# Altium footprint library 3.22-杂项.PcbLib: 985 footprints (part 57 of 64)
Each footprint in its own frame and in the unit in brackets; x right, y up, seen from the top. Pads: shape width x height; smd on the part's side, far side on the other; paste and mask are expansions set on the pad; w line width, h text height; cw(c..) or ccw(c..) is an arc to the next point about the centre after c.
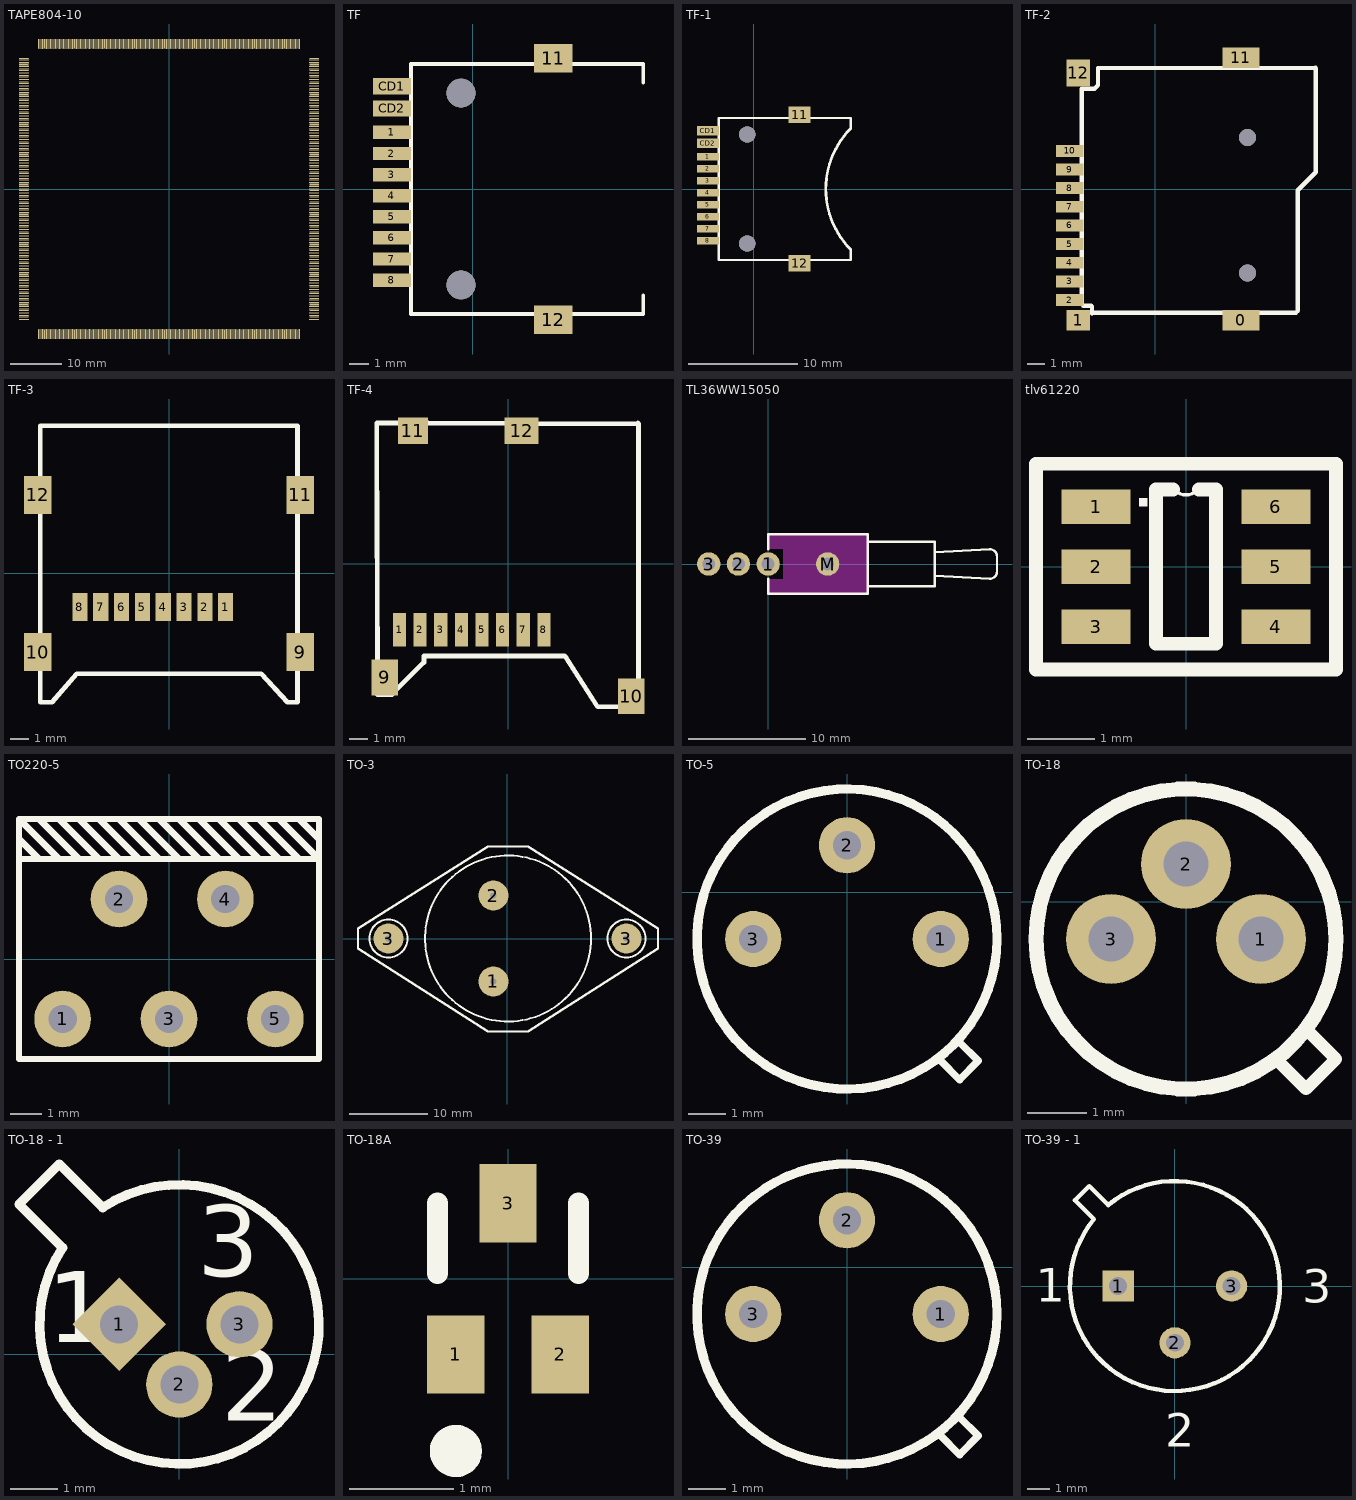
[diagram p56: the footprints below, top view; thin cyan lines are the x and y axes]

## TAPE804-10 [mil]
pads (804):
  oval 75x5 smd: 1(-1112.5,999.5) 2(-1112.5,989.5) 3(-1112.5,979.5) 4(-1112.5,969.5) 5(-1112.5,959.5) 6(-1112.5,949.5) 7(-1112.5,939.5) 8(-1112.5,929.5) 9(-1112.5,919.5) 10(-1112.5,909.5) 11(-1112.5,899.5) 12(-1112.5,889.5) 13(-1112.5,879.5) 14(-1112.5,869.5) 15(-1112.5,859.5) 16(-1112.5,849.5) 17(-1112.5,839.5) 18(-1112.5,829.5) 19(-1112.5,819.5) 20(-1112.5,809.5) 21(-1112.5,799.5) 22(-1112.5,789.5) 23(-1112.5,779.5) 24(-1112.5,769.5) 25(-1112.5,759.5) 26(-1112.5,749.5) 27(-1112.5,739.5) 28(-1112.5,729.5) 29(-1112.5,719.5) 30(-1112.5,709.5) 31(-1112.5,699.5) 32(-1112.5,689.5) 33(-1112.5,679.5) 34(-1112.5,669.5) 35(-1112.5,659.5) 36(-1112.5,649.5) 37(-1112.5,639.5) 38(-1112.5,629.5) 39(-1112.5,619.5) 40(-1112.5,609.5) 41(-1112.5,599.5) 42(-1112.5,589.5) 43(-1112.5,579.5) 44(-1112.5,569.5) 45(-1112.5,559.5) 46(-1112.5,549.5) 47(-1112.5,539.5) 48(-1112.5,529.5) 49(-1112.5,519.5) 50(-1112.5,509.5) 51(-1112.5,499.5) 52(-1112.5,489.5) 53(-1112.5,479.5) 54(-1112.5,469.5) 55(-1112.5,459.5) 56(-1112.5,449.5) 57(-1112.5,439.5) 58(-1112.5,429.5) 59(-1112.5,419.5) 60(-1112.5,409.5) 61(-1112.5,399.5) 62(-1112.5,389.5) 63(-1112.5,379.5) 64(-1112.5,369.5) 65(-1112.5,359.5) 66(-1112.5,349.5) 67(-1112.5,339.5) 68(-1112.5,329.5) 69(-1112.5,319.5) 70(-1112.5,309.5) 71(-1112.5,299.5) 72(-1112.5,289.5) 73(-1112.5,279.5) 74(-1112.5,269.5) 75(-1112.5,259.5) 76(-1112.5,249.5) 77(-1112.5,239.5) 78(-1112.5,229.5) 79(-1112.5,219.5) 80(-1112.5,209.5) 81(-1112.5,199.5) 82(-1112.5,189.5) 83(-1112.5,179.5) 84(-1112.5,169.5) 85(-1112.5,159.5) 86(-1112.5,149.5) 87(-1112.5,139.5) 88(-1112.5,129.5) 89(-1112.5,119.5) 90(-1112.5,109.5) 91(-1112.5,99.5) 92(-1112.5,89.5) 93(-1112.5,79.5) 94(-1112.5,69.5) 95(-1112.5,59.5) 96(-1112.5,49.5) 97(-1112.5,39.5) 98(-1112.5,29.5) 99(-1112.5,19.5) 100(-1112.5,9.5) 101(-1112.5,-0.5) 102(-1112.5,-10.5) 103(-1112.5,-20.5) 104(-1112.5,-30.5) 105(-1112.5,-40.5) 106(-1112.5,-50.5) 107(-1112.5,-60.5) 108(-1112.5,-70.5) 109(-1112.5,-80.5) 110(-1112.5,-90.5) 111(-1112.5,-100.5) 112(-1112.5,-110.5) 113(-1112.5,-120.5) 114(-1112.5,-130.5) 115(-1112.5,-140.5) 116(-1112.5,-150.5) 117(-1112.5,-160.5) 118(-1112.5,-170.5) 119(-1112.5,-180.5) 120(-1112.5,-190.5) 121(-1112.5,-200.5) 122(-1112.5,-210.5) 123(-1112.5,-220.5) 124(-1112.5,-230.5) 125(-1112.5,-240.5) 126(-1112.5,-250.5) 127(-1112.5,-260.5) 128(-1112.5,-270.5) 129(-1112.5,-280.5) 130(-1112.5,-290.5) 131(-1112.5,-300.5) 132(-1112.5,-310.5) 133(-1112.5,-320.5) 134(-1112.5,-330.5) 135(-1112.5,-340.5) 136(-1112.5,-350.5) 137(-1112.5,-360.5) 138(-1112.5,-370.5) 139(-1112.5,-380.5) 140(-1112.5,-390.5) 141(-1112.5,-400.5) 142(-1112.5,-410.5) 143(-1112.5,-420.5) 144(-1112.5,-430.5) 145(-1112.5,-440.5) 146(-1112.5,-450.5) 147(-1112.5,-460.5) 148(-1112.5,-470.5) 149(-1112.5,-480.5) 150(-1112.5,-490.5) 151(-1112.5,-500.5) 152(-1112.5,-510.5) 153(-1112.5,-520.5) 154(-1112.5,-530.5) 155(-1112.5,-540.5) 156(-1112.5,-550.5) 157(-1112.5,-560.5) 158(-1112.5,-570.5) 159(-1112.5,-580.5) 160(-1112.5,-590.5) 161(-1112.5,-600.5) 162(-1112.5,-610.5) 163(-1112.5,-620.5) 164(-1112.5,-630.5) 165(-1112.5,-640.5) 166(-1112.5,-650.5) 167(-1112.5,-660.5) 168(-1112.5,-670.5) 169(-1112.5,-680.5) 170(-1112.5,-690.5) 171(-1112.5,-700.5) 172(-1112.5,-710.5) 173(-1112.5,-720.5) 174(-1112.5,-730.5) 175(-1112.5,-740.5) 176(-1112.5,-750.5) 177(-1112.5,-760.5) 178(-1112.5,-770.5) 179(-1112.5,-780.5) 180(-1112.5,-790.5) 181(-1112.5,-800.5) 182(-1112.5,-810.5) 183(-1112.5,-820.5) 184(-1112.5,-830.5) 185(-1112.5,-840.5) 186(-1112.5,-850.5) 187(-1112.5,-860.5) 188(-1112.5,-870.5) 189(-1112.5,-880.5) 190(-1112.5,-890.5) 191(-1112.5,-900.5) 192(-1112.5,-910.5) 193(-1112.5,-920.5) 194(-1112.5,-930.5) 195(-1112.5,-940.5) 196(-1112.5,-950.5) 197(-1112.5,-960.5) 198(-1112.5,-970.5) 199(-1112.5,-980.5) 200(-1112.5,-990.5) 201(-1112.5,-1000.5) 403(1112.5,-1000.5) 404(1112.5,-990.5) 405(1112.5,-980.5) 406(1112.5,-970.5) 407(1112.5,-960.5) 408(1112.5,-950.5) 409(1112.5,-940.5) 410(1112.5,-930.5) 411(1112.5,-920.5) 412(1112.5,-910.5) 413(1112.5,-900.5) 414(1112.5,-890.5) 415(1112.5,-880.5) 416(1112.5,-870.5) 417(1112.5,-860.5) 418(1112.5,-850.5) 419(1112.5,-840.5) 420(1112.5,-830.5) 421(1112.5,-820.5) 422(1112.5,-810.5) 423(1112.5,-800.5) 424(1112.5,-790.5) 425(1112.5,-780.5) 426(1112.5,-770.5) 427(1112.5,-760.5) 428(1112.5,-750.5) 429(1112.5,-740.5) 430(1112.5,-730.5) 431(1112.5,-720.5) 432(1112.5,-710.5) 433(1112.5,-700.5) 434(1112.5,-690.5) 435(1112.5,-680.5) 436(1112.5,-670.5) 437(1112.5,-660.5) 438(1112.5,-650.5) 439(1112.5,-640.5) 440(1112.5,-630.5) 441(1112.5,-620.5) 442(1112.5,-610.5) 443(1112.5,-600.5) 444(1112.5,-590.5) 445(1112.5,-580.5) 446(1112.5,-570.5) 447(1112.5,-560.5) 448(1112.5,-550.5) 449(1112.5,-540.5) 450(1112.5,-530.5) 451(1112.5,-520.5) 452(1112.5,-510.5) 453(1112.5,-500.5) 454(1112.5,-490.5) 455(1112.5,-480.5) 456(1112.5,-470.5) 457(1112.5,-460.5) 458(1112.5,-450.5) 459(1112.5,-440.5) 460(1112.5,-430.5) 461(1112.5,-420.5) 462(1112.5,-410.5) 463(1112.5,-400.5) 464(1112.5,-390.5) 465(1112.5,-380.5) 466(1112.5,-370.5) 467(1112.5,-360.5) 468(1112.5,-350.5) 469(1112.5,-340.5) 470(1112.5,-330.5) 471(1112.5,-320.5) 472(1112.5,-310.5) 473(1112.5,-300.5) 474(1112.5,-290.5) 475(1112.5,-280.5) 476(1112.5,-270.5) 477(1112.5,-260.5) 478(1112.5,-250.5) 479(1112.5,-240.5) 480(1112.5,-230.5) 481(1112.5,-220.5) 482(1112.5,-210.5) 483(1112.5,-200.5) 484(1112.5,-190.5) 485(1112.5,-180.5) 486(1112.5,-170.5) 487(1112.5,-160.5) 488(1112.5,-150.5) 489(1112.5,-140.5) 490(1112.5,-130.5) 491(1112.5,-120.5) 492(1112.5,-110.5) 493(1112.5,-100.5) 494(1112.5,-90.5) 495(1112.5,-80.5) 496(1112.5,-70.5) 497(1112.5,-60.5) 498(1112.5,-50.5) 499(1112.5,-40.5) 500(1112.5,-30.5) 501(1112.5,-20.5) 502(1112.5,-10.5) 503(1112.5,-0.5) 504(1112.5,9.5) 505(1112.5,19.5) 506(1112.5,29.5) 507(1112.5,39.5) 508(1112.5,49.5) 509(1112.5,59.5) 510(1112.5,69.5) 511(1112.5,79.5) 512(1112.5,89.5) 513(1112.5,99.5) 514(1112.5,109.5) 515(1112.5,119.5) 516(1112.5,129.5) 517(1112.5,139.5) 518(1112.5,149.5) 519(1112.5,159.5) 520(1112.5,169.5) 521(1112.5,179.5) 522(1112.5,189.5) 523(1112.5,199.5) 524(1112.5,209.5) 525(1112.5,219.5) 526(1112.5,229.5) 527(1112.5,239.5) 528(1112.5,249.5) 529(1112.5,259.5) 530(1112.5,269.5) 531(1112.5,279.5) 532(1112.5,289.5) 533(1112.5,299.5) 534(1112.5,309.5) 535(1112.5,319.5) 536(1112.5,329.5) 537(1112.5,339.5) 538(1112.5,349.5) 539(1112.5,359.5) 540(1112.5,369.5) 541(1112.5,379.5) 542(1112.5,389.5) 543(1112.5,399.5) 544(1112.5,409.5) 545(1112.5,419.5) 546(1112.5,429.5) 547(1112.5,439.5) 548(1112.5,449.5) 549(1112.5,459.5) 550(1112.5,469.5) 551(1112.5,479.5) 552(1112.5,489.5) 553(1112.5,499.5) 554(1112.5,509.5) 555(1112.5,519.5) 556(1112.5,529.5) 557(1112.5,539.5) 558(1112.5,549.5) 559(1112.5,559.5) 560(1112.5,569.5) 561(1112.5,579.5) 562(1112.5,589.5) 563(1112.5,599.5) 564(1112.5,609.5) 565(1112.5,619.5) 566(1112.5,629.5) 567(1112.5,639.5) 568(1112.5,649.5) 569(1112.5,659.5) 570(1112.5,669.5) 571(1112.5,679.5) 572(1112.5,689.5) 573(1112.5,699.5) 574(1112.5,709.5) 575(1112.5,719.5) 576(1112.5,729.5) 577(1112.5,739.5) 578(1112.5,749.5) 579(1112.5,759.5) 580(1112.5,769.5) 581(1112.5,779.5) 582(1112.5,789.5) 583(1112.5,799.5) 584(1112.5,809.5) 585(1112.5,819.5) 586(1112.5,829.5) 587(1112.5,839.5) 588(1112.5,849.5) 589(1112.5,859.5) 590(1112.5,869.5) 591(1112.5,879.5) 592(1112.5,889.5) 593(1112.5,899.5) 594(1112.5,909.5) 595(1112.5,919.5) 596(1112.5,929.5) 597(1112.5,939.5) 598(1112.5,949.5) 599(1112.5,959.5) 600(1112.5,969.5) 601(1112.5,979.5) 602(1112.5,989.5) 603(1112.5,999.5)
  oval 5x75 smd: 202(-999.5,-1112.5) 203(-989.5,-1112.5) 204(-979.5,-1112.5) 205(-969.5,-1112.5) 206(-959.5,-1112.5) 207(-949.5,-1112.5) 208(-939.5,-1112.5) 209(-929.5,-1112.5) 210(-919.5,-1112.5) 211(-909.5,-1112.5) 212(-899.5,-1112.5) 213(-889.5,-1112.5) 214(-879.5,-1112.5) 215(-869.5,-1112.5) 216(-859.5,-1112.5) 217(-849.5,-1112.5) 218(-839.5,-1112.5) 219(-829.5,-1112.5) 220(-819.5,-1112.5) 221(-809.5,-1112.5) 222(-799.5,-1112.5) 223(-789.5,-1112.5) 224(-779.5,-1112.5) 225(-769.5,-1112.5) 226(-759.5,-1112.5) 227(-749.5,-1112.5) 228(-739.5,-1112.5) 229(-729.5,-1112.5) 230(-719.5,-1112.5) 231(-709.5,-1112.5) 232(-699.5,-1112.5) 233(-689.5,-1112.5) 234(-679.5,-1112.5) 235(-669.5,-1112.5) 236(-659.5,-1112.5) 237(-649.5,-1112.5) 238(-639.5,-1112.5) 239(-629.5,-1112.5) 240(-619.5,-1112.5) 241(-609.5,-1112.5) 242(-599.5,-1112.5) 243(-589.5,-1112.5) 244(-579.5,-1112.5) 245(-569.5,-1112.5) 246(-559.5,-1112.5) 247(-549.5,-1112.5) 248(-539.5,-1112.5) 249(-529.5,-1112.5) 250(-519.5,-1112.5) 251(-509.5,-1112.5) 252(-499.5,-1112.5) 253(-489.5,-1112.5) 254(-479.5,-1112.5) 255(-469.5,-1112.5) 256(-459.5,-1112.5) 257(-449.5,-1112.5) 258(-439.5,-1112.5) 259(-429.5,-1112.5) 260(-419.5,-1112.5) 261(-409.5,-1112.5) 262(-399.5,-1112.5) 263(-389.5,-1112.5) 264(-379.5,-1112.5) 265(-369.5,-1112.5) 266(-359.5,-1112.5) 267(-349.5,-1112.5) 268(-339.5,-1112.5) 269(-329.5,-1112.5) 270(-319.5,-1112.5) 271(-309.5,-1112.5) 272(-299.5,-1112.5) 273(-289.5,-1112.5) 274(-279.5,-1112.5) 275(-269.5,-1112.5) 276(-259.5,-1112.5) 277(-249.5,-1112.5) 278(-239.5,-1112.5) 279(-229.5,-1112.5) 280(-219.5,-1112.5) 281(-209.5,-1112.5) 282(-199.5,-1112.5) 283(-189.5,-1112.5) 284(-179.5,-1112.5) 285(-169.5,-1112.5) 286(-159.5,-1112.5) 287(-149.5,-1112.5) 288(-139.5,-1112.5) 289(-129.5,-1112.5) 290(-119.5,-1112.5) 291(-109.5,-1112.5) 292(-99.5,-1112.5) 293(-89.5,-1112.5) 294(-79.5,-1112.5) 295(-69.5,-1112.5) 296(-59.5,-1112.5) 297(-49.5,-1112.5) 298(-39.5,-1112.5) 299(-29.5,-1112.5) 300(-19.5,-1112.5) 301(-9.5,-1112.5) 302(0.5,-1112.5) 303(10.5,-1112.5) 304(20.5,-1112.5) 305(30.5,-1112.5) 306(40.5,-1112.5) 307(50.5,-1112.5) 308(60.5,-1112.5) 309(70.5,-1112.5) 310(80.5,-1112.5) 311(90.5,-1112.5) 312(100.5,-1112.5) 313(110.5,-1112.5) 314(120.5,-1112.5) 315(130.5,-1112.5) 316(140.5,-1112.5) 317(150.5,-1112.5) 318(160.5,-1112.5) 319(170.5,-1112.5) 320(180.5,-1112.5) 321(190.5,-1112.5) 322(200.5,-1112.5) 323(210.5,-1112.5) 324(220.5,-1112.5) 325(230.5,-1112.5) 326(240.5,-1112.5) 327(250.5,-1112.5) 328(260.5,-1112.5) 329(270.5,-1112.5) 330(280.5,-1112.5) 331(290.5,-1112.5) 332(300.5,-1112.5) 333(310.5,-1112.5) 334(320.5,-1112.5) 335(330.5,-1112.5) 336(340.5,-1112.5) 337(350.5,-1112.5) 338(360.5,-1112.5) 339(370.5,-1112.5) 340(380.5,-1112.5) 341(390.5,-1112.5) 342(400.5,-1112.5) 343(410.5,-1112.5) 344(420.5,-1112.5) 345(430.5,-1112.5) 346(440.5,-1112.5) 347(450.5,-1112.5) 348(460.5,-1112.5) 349(470.5,-1112.5) 350(480.5,-1112.5) 351(490.5,-1112.5) 352(500.5,-1112.5) 353(510.5,-1112.5) 354(520.5,-1112.5) 355(530.5,-1112.5) 356(540.5,-1112.5) 357(550.5,-1112.5) 358(560.5,-1112.5) 359(570.5,-1112.5) 360(580.5,-1112.5) 361(590.5,-1112.5) 362(600.5,-1112.5) 363(610.5,-1112.5) 364(620.5,-1112.5) 365(630.5,-1112.5) 366(640.5,-1112.5) 367(650.5,-1112.5) 368(660.5,-1112.5) 369(670.5,-1112.5) 370(680.5,-1112.5) 371(690.5,-1112.5) 372(700.5,-1112.5) 373(710.5,-1112.5) 374(720.5,-1112.5) 375(730.5,-1112.5) 376(740.5,-1112.5) 377(750.5,-1112.5) 378(760.5,-1112.5) 379(770.5,-1112.5) 380(780.5,-1112.5) 381(790.5,-1112.5) 382(800.5,-1112.5) 383(810.5,-1112.5) 384(820.5,-1112.5) 385(830.5,-1112.5) 386(840.5,-1112.5) 387(850.5,-1112.5) 388(860.5,-1112.5) 389(870.5,-1112.5) 390(880.5,-1112.5) 391(890.5,-1112.5) 392(900.5,-1112.5) 393(910.5,-1112.5) 394(920.5,-1112.5) 395(930.5,-1112.5) 396(940.5,-1112.5) 397(950.5,-1112.5) 398(960.5,-1112.5) 399(970.5,-1112.5) 400(980.5,-1112.5) 401(990.5,-1112.5) 402(1000.5,-1112.5) 604(1000.5,1112.5) 605(990.5,1112.5) 606(980.5,1112.5) 607(970.5,1112.5) 608(960.5,1112.5) 609(950.5,1112.5) 610(940.5,1112.5) 611(930.5,1112.5) 612(920.5,1112.5) 613(910.5,1112.5) 614(900.5,1112.5) 615(890.5,1112.5) 616(880.5,1112.5) 617(870.5,1112.5) 618(860.5,1112.5) 619(850.5,1112.5) 620(840.5,1112.5) 621(830.5,1112.5) 622(820.5,1112.5) 623(810.5,1112.5) 624(800.5,1112.5) 625(790.5,1112.5) 626(780.5,1112.5) 627(770.5,1112.5) 628(760.5,1112.5) 629(750.5,1112.5) 630(740.5,1112.5) 631(730.5,1112.5) 632(720.5,1112.5) 633(710.5,1112.5) 634(700.5,1112.5) 635(690.5,1112.5) 636(680.5,1112.5) 637(670.5,1112.5) 638(660.5,1112.5) 639(650.5,1112.5) 640(640.5,1112.5) 641(630.5,1112.5) 642(620.5,1112.5) 643(610.5,1112.5) 644(600.5,1112.5) 645(590.5,1112.5) 646(580.5,1112.5) 647(570.5,1112.5) 648(560.5,1112.5) 649(550.5,1112.5) 650(540.5,1112.5) 651(530.5,1112.5) 652(520.5,1112.5) 653(510.5,1112.5) 654(500.5,1112.5) 655(490.5,1112.5) 656(480.5,1112.5) 657(470.5,1112.5) 658(460.5,1112.5) 659(450.5,1112.5) 660(440.5,1112.5) 661(430.5,1112.5) 662(420.5,1112.5) 663(410.5,1112.5) 664(400.5,1112.5) 665(390.5,1112.5) 666(380.5,1112.5) 667(370.5,1112.5) 668(360.5,1112.5) 669(350.5,1112.5) 670(340.5,1112.5) 671(330.5,1112.5) 672(320.5,1112.5) 673(310.5,1112.5) 674(300.5,1112.5) 675(290.5,1112.5) 676(280.5,1112.5) 677(270.5,1112.5) 678(260.5,1112.5) 679(250.5,1112.5) 680(240.5,1112.5) 681(230.5,1112.5) 682(220.5,1112.5) 683(210.5,1112.5) 684(200.5,1112.5) 685(190.5,1112.5) 686(180.5,1112.5) 687(170.5,1112.5) 688(160.5,1112.5) 689(150.5,1112.5) 690(140.5,1112.5) 691(130.5,1112.5) 692(120.5,1112.5) 693(110.5,1112.5) 694(100.5,1112.5) 695(90.5,1112.5) 696(80.5,1112.5) 697(70.5,1112.5) 698(60.5,1112.5) 699(50.5,1112.5) 700(40.5,1112.5) 701(30.5,1112.5) 702(20.5,1112.5) 703(10.5,1112.5) 704(0.5,1112.5) 705(-9.5,1112.5) 706(-19.5,1112.5) 707(-29.5,1112.5) 708(-39.5,1112.5) 709(-49.5,1112.5) 710(-59.5,1112.5) 711(-69.5,1112.5) 712(-79.5,1112.5) 713(-89.5,1112.5) 714(-99.5,1112.5) 715(-109.5,1112.5) 716(-119.5,1112.5) 717(-129.5,1112.5) 718(-139.5,1112.5) 719(-149.5,1112.5) 720(-159.5,1112.5) 721(-169.5,1112.5) 722(-179.5,1112.5) 723(-189.5,1112.5) 724(-199.5,1112.5) 725(-209.5,1112.5) 726(-219.5,1112.5) 727(-229.5,1112.5) 728(-239.5,1112.5) 729(-249.5,1112.5) 730(-259.5,1112.5) 731(-269.5,1112.5) 732(-279.5,1112.5) 733(-289.5,1112.5) 734(-299.5,1112.5) 735(-309.5,1112.5) 736(-319.5,1112.5) 737(-329.5,1112.5) 738(-339.5,1112.5) 739(-349.5,1112.5) 740(-359.5,1112.5) 741(-369.5,1112.5) 742(-379.5,1112.5) 743(-389.5,1112.5) 744(-399.5,1112.5) 745(-409.5,1112.5) 746(-419.5,1112.5) 747(-429.5,1112.5) 748(-439.5,1112.5) 749(-449.5,1112.5) 750(-459.5,1112.5) 751(-469.5,1112.5) 752(-479.5,1112.5) 753(-489.5,1112.5) 754(-499.5,1112.5) 755(-509.5,1112.5) 756(-519.5,1112.5) 757(-529.5,1112.5) 758(-539.5,1112.5) 759(-549.5,1112.5) 760(-559.5,1112.5) 761(-569.5,1112.5) 762(-579.5,1112.5) 763(-589.5,1112.5) 764(-599.5,1112.5) 765(-609.5,1112.5) 766(-619.5,1112.5) 767(-629.5,1112.5) 768(-639.5,1112.5) 769(-649.5,1112.5) 770(-659.5,1112.5) 771(-669.5,1112.5) 772(-679.5,1112.5) 773(-689.5,1112.5) 774(-699.5,1112.5) 775(-709.5,1112.5) 776(-719.5,1112.5) 777(-729.5,1112.5) 778(-739.5,1112.5) 779(-749.5,1112.5) 780(-759.5,1112.5) 781(-769.5,1112.5) 782(-779.5,1112.5) 783(-789.5,1112.5) 784(-799.5,1112.5) 785(-809.5,1112.5) 786(-819.5,1112.5) 787(-829.5,1112.5) 788(-839.5,1112.5) 789(-849.5,1112.5) 790(-859.5,1112.5) 791(-869.5,1112.5) 792(-879.5,1112.5) 793(-889.5,1112.5) 794(-899.5,1112.5) 795(-909.5,1112.5) 796(-919.5,1112.5) 797(-929.5,1112.5) 798(-939.5,1112.5) 799(-949.5,1112.5) 800(-959.5,1112.5) 801(-969.5,1112.5) 802(-979.5,1112.5) 803(-989.5,1112.5) 804(-999.5,1112.5)

## TF [mm]
pads (14):
  rect 2x0.7 smd: 1(-4.2,2.95) 2(-4.2,1.85) 3(-4.2,0.75) 4(-4.2,-0.35) 5(-4.2,-1.45) 6(-4.2,-2.55) 7(-4.2,-3.65) 8(-4.2,-4.75)
  rect 2x1.5 smd: 11(4.2,6.82) 12(4.2,-6.82)
  rect 2x0.85 smd: CD1(-4.2,5.35) CD2(-4.2,4.2)
  round 1.5 hole 1.5 unplated: ""(-0.6,-5)
  round 1.5 hole 1.5: ""(-0.6,5)
Top Overlay:
  lines w0.2: 8.9,-5.55 8.9,-6.515 -3.2,-6.515 -3.2,6.515 8.9,6.515 8.9,5.55

## TF-1 [mm]
pads (14):
  rect 2x0.7 smd: 1(-4.2,2.95) 2(-4.2,1.85) 3(-4.2,0.75) 4(-4.2,-0.35) 5(-4.2,-1.45) 6(-4.2,-2.55) 7(-4.2,-3.65) 8(-4.2,-4.75)
  rect 2x1.5 smd: 11(4.2,6.82) 12(4.2,-6.82)
  rect 2x0.85 smd: CD1(-4.2,5.35) CD2(-4.2,4.2)
  round 1.5 hole 1.5 unplated: ""(-0.6,-5)
  round 1.5 hole 1.5: ""(-0.6,5)
Top Overlay:
  lines w0.2: 8.9,-5.55 8.9,-6.515 -3.2,-6.515 -3.2,6.515 8.9,6.515 8.9,5.55
  lines w0.254: 8.9,-5.55 cw(c14.45,0) 8.9,5.55

## TF-2 [mm]
pads (13):
  rect 2.2x1.2 smd: 0(5.05,-7.75) 11(5.05,7.75)
  rect 1.4x1.2 smd: 1(-4.55,-7.75)
  rect 1.6x0.7 smd: 2(-5.05,-6.55) 3(-5.05,-5.45) 4(-5.05,-4.35) 5(-5.05,-3.25) 6(-5.05,-2.15) 7(-5.05,-1.05) 8(-5.05,0.05) 9(-5.05,1.15) 10(-5.05,2.25)
  rect 1.4x1.6 smd: 12(-4.55,6.85)
via 5.45,3.05 diameter 1 hole 1
via 5.45,-4.95 diameter 1 hole 1
Top Layer:
  lines w0.254: -3.738,-7.344 -3.688,-7.293
Top Overlay:
  lines w0.254: -3.738,-7.344 -3.738,-6.937 -3.789,-6.886 -4.246,-6.886 -4.348,-6.785 -4.348,5.915 -3.586,5.915 -3.383,6.118 -3.383,7.134 9.45,7.15 ; -3.688,-7.293 8.301,-7.293 8.403,-7.191 8.403,-0.079 9.47,0.988 9.47,7.13

## TF-3 [mm]
pads (12):
  rect 0.8x1.5 smd: 1(2.993,-1.772) 2(1.893,-1.772) 3(0.793,-1.772) 4(-0.307,-1.772) 5(-1.407,-1.772) 6(-2.507,-1.772) 7(-3.607,-1.772) 8(-4.707,-1.772)
  rect 1.45x2 smd: 9(6.925,-4.15) 10(-6.925,-4.15) 11(6.925,4.15) 12(-6.925,4.15)
Top Overlay:
  lines w0.254: -6.805,-6.8 -6.182,-6.8 -4.875,-5.3 4.865,-5.3 6.264,-6.8 6.795,-6.8 6.795,7.8 -6.805,7.8 -6.805,-6.8

## TF-4 [mm]
pads (12):
  rect 0.7x1.8 smd: 1(-5.785,-3.525) 2(-4.685,-3.525) 3(-3.585,-3.525) 4(-2.485,-3.525) 5(-1.385,-3.525) 6(-0.285,-3.525) 7(0.815,-3.525) 8(1.915,-3.525)
  rect 1.4x1.9 smd: 9(-6.575,-6.075) 10(6.575,-7.075)
  rect 1.6x1.4 smd: 11(-5.075,7.075)
  rect 1.8x1.4 smd: 12(0.725,7.075)
Top Overlay:
  lines w0.254: -4.261,7.499 -7.004,7.499 ; 6.864,7.448 -7.004,7.499 ; 6.915,7.499 6.966,7.448 6.966,-7.64 ; 7.017,-7.589 6.966,-7.64 ; -7.004,7.499 -6.953,-6.979 -6.191,-6.979 -4.485,-5.273 -4.485,-4.925 2.935,-4.925 3.032,-4.925 4.781,-7.64 6.966,-7.64

## TL36WW15050 [mm] "SPDT Subminiature Toggle Switch, Right Angle Mounting, Vertical Actuation"
pads (4):
  round 2 hole 1.1: 1(0,0) 2(-2.54,0) 3(-5.08,0) M(5.08,0)
Top Layer keep-out:
  region: 1.27,2.54 1.27,-2.54 8.509,-2.54 8.509,2.54
  region: 0,2.54 0,1.27 1.27,1.27 1.27,2.54
  region: 0,-1.27 0,-2.54 1.27,-2.54 1.27,-1.27
Top Overlay:
  lines w0.2: 0,-1.27 0,-2.54 8.509,-2.54 8.509,2.54 0,2.54 0,1.27 ; 8.509,-1.905 14.224,-1.905 14.224,1.905 8.509,1.905 ; 14.224,-1.016 18.923,-1.27 ccw(c18.923,-0.635) 19.558,-0.635 19.558,0.635 ccw(c18.923,0.635) 18.923,1.27 14.224,1.016

## tlv61220 [mil]
pads (6):
  rect 40x20 smd mask+2: 1(-52.5,35) 2(-52.5,0) 3(-52.5,-35) 4(52.5,-35) 5(52.5,0) 6(52.5,35)
Top Overlay:
  rectangle: -27.5,35 -22.5,40
  lines w2: -7.5,45 ccw(c0,52.5) 7.5,45
  lines w8: -7.5,45 -17.5,45 -17.5,-45 17.5,-45 17.5,45 7.5,45 ; -87.5,-60 87.5,-60 87.5,60 -87.5,60 -87.5,-60

## TO220-5 [mm]
pads (5):
  round 1.8 hole 0.9: 1(-3.378,-1.905) 2(-1.587,1.905) 3(0,-1.905) 4(1.791,1.905) 5(3.378,-1.905)
Top Overlay:
  lines w0.203: -4.763,3.81 -4.127,3.175 ; -4.127,4.445 -2.857,3.175 ; -3.492,3.175 -4.763,4.445 ; -2.222,3.175 -3.492,4.445 -2.857,4.445 -1.587,3.175 ; -2.222,4.445 -0.953,3.175 ; -1.587,4.445 -0.318,3.175 ; -0.953,4.445 0.318,3.175 ; -0.318,4.445 0.953,3.175 ; 0.318,4.445 1.587,3.175 ; 0.953,4.445 2.222,3.175 ; 1.587,4.445 2.857,3.175 ; 2.222,4.445 3.492,3.175 ; 2.857,4.445 4.127,3.175 ; 3.492,4.445 4.763,3.175 ; 4.127,4.445 4.763,3.81 ; -4.763,3.175 -4.763,-3.175 4.763,-3.175 4.763,3.175 ; -4.763,3.175 -4.763,4.445 ; -4.763,3.175 4.763,3.175 ; -4.763,4.445 4.763,4.445 4.763,3.175

## TO-3 [mil]
pads (4):
  round 150 hole 32: 1(-70,-215) 2(-70,215) 3(-595,0) 3(595,0)
Top Overlay:
  circle w10: c-595,0 r95
  circle w10: c595,0 r95
  circle w10: c3,0 r415
  lines w12: -747,-50 -747,50 -97,460 103,460 753,50 753,-50 103,-465 -97,-465 -747,-50

## TO-5 [mil]
pads (3):
  round 60 hole 30: 1(100,-50) 2(0,50) 3(-100,-50)
Top Overlay:
  circle w10: c0,-50 r160
  lines w8: 100,-180 120,-200 140,-180 120,-160

## TO-18 [mil]
pads (3):
  round 60 hole 30: 1(50,-25) 2(0,25) 3(-50,-25)
Top Overlay:
  circle w10: c0,-25 r100
  lines w8: 60,-105 80,-125 100,-105 80,-85

## TO-18 - 1 [mm] "Can; 3 Leads; Pin Circle Dia. 2.54 mm; Lead Dia. 0.48 mm (max)"
height 5.33
pads (3):
  rect 1.4x1.4 hole 0.8 rot 45: 1(-1.27,0.635)
  round 1.4 hole 0.8: 2(0,-0.635) 3(1.27,0.635)
Top Overlay:
  lines w0.2: -3.386,3.172 -2.537,4.021 -1.618,3.102 cw(c0,0.635) -2.467,2.253 -3.386,3.172
  text "1" at -2.794,0.254 h1.5
  text "2" at 0.889,-1.397 h1.5
  text "3" at 0.381,1.651 h1.5

## TO-18A [mm] "SC-89; 3 Flat Leads; Body 1.6 x 1.6 x 0.7 mm, inc leads (LxWxH typ)"
height 0.8
pads (3):
  rect 0.55x0.75 smd: 1(-0.5,-0.725) 2(0.5,-0.725) 3(0,0.725)
Top Overlay:
  circle w0.25: c-0.5,-1.65 r0.125
  lines w0.2: -0.676,0.05 -0.676,0.725 ; 0.675,0.05 0.675,0.725

## TO-39 [mil]
pads (3):
  round 60 hole 30: 1(100,-50) 2(0,50) 3(-100,-50)
Top Overlay:
  circle w10: c0,-50 r160
  lines w8: 100,-180 120,-200 140,-180 120,-160

## TO-39 - 1 [mm] "Can; 3 Leads; Pin Circle Dia. 5.08 mm; Lead Dia. 0.48 mm (max)"
height 4.55
pads (3):
  rect 1.4x1.4 hole 0.8: 1(-2.54,0)
  round 1.4 hole 0.8: 2(0,-2.54) 3(2.54,0)
Top Overlay:
  lines w0.2: -4.475,3.838 -3.626,2.99 ccw(c0,0) -2.99,3.626 -3.838,4.475 -4.475,3.838
  text "1" at -6.219,-0.697 h1.5
  text "2" at -0.433,-7.203 h1.5
  text "3" at 5.712,-0.751 h1.5